# Altium schematic symbol library relay.SCHLIB: 425 symbols (part 1 of 3) (continued)
## G5V1 (continued)
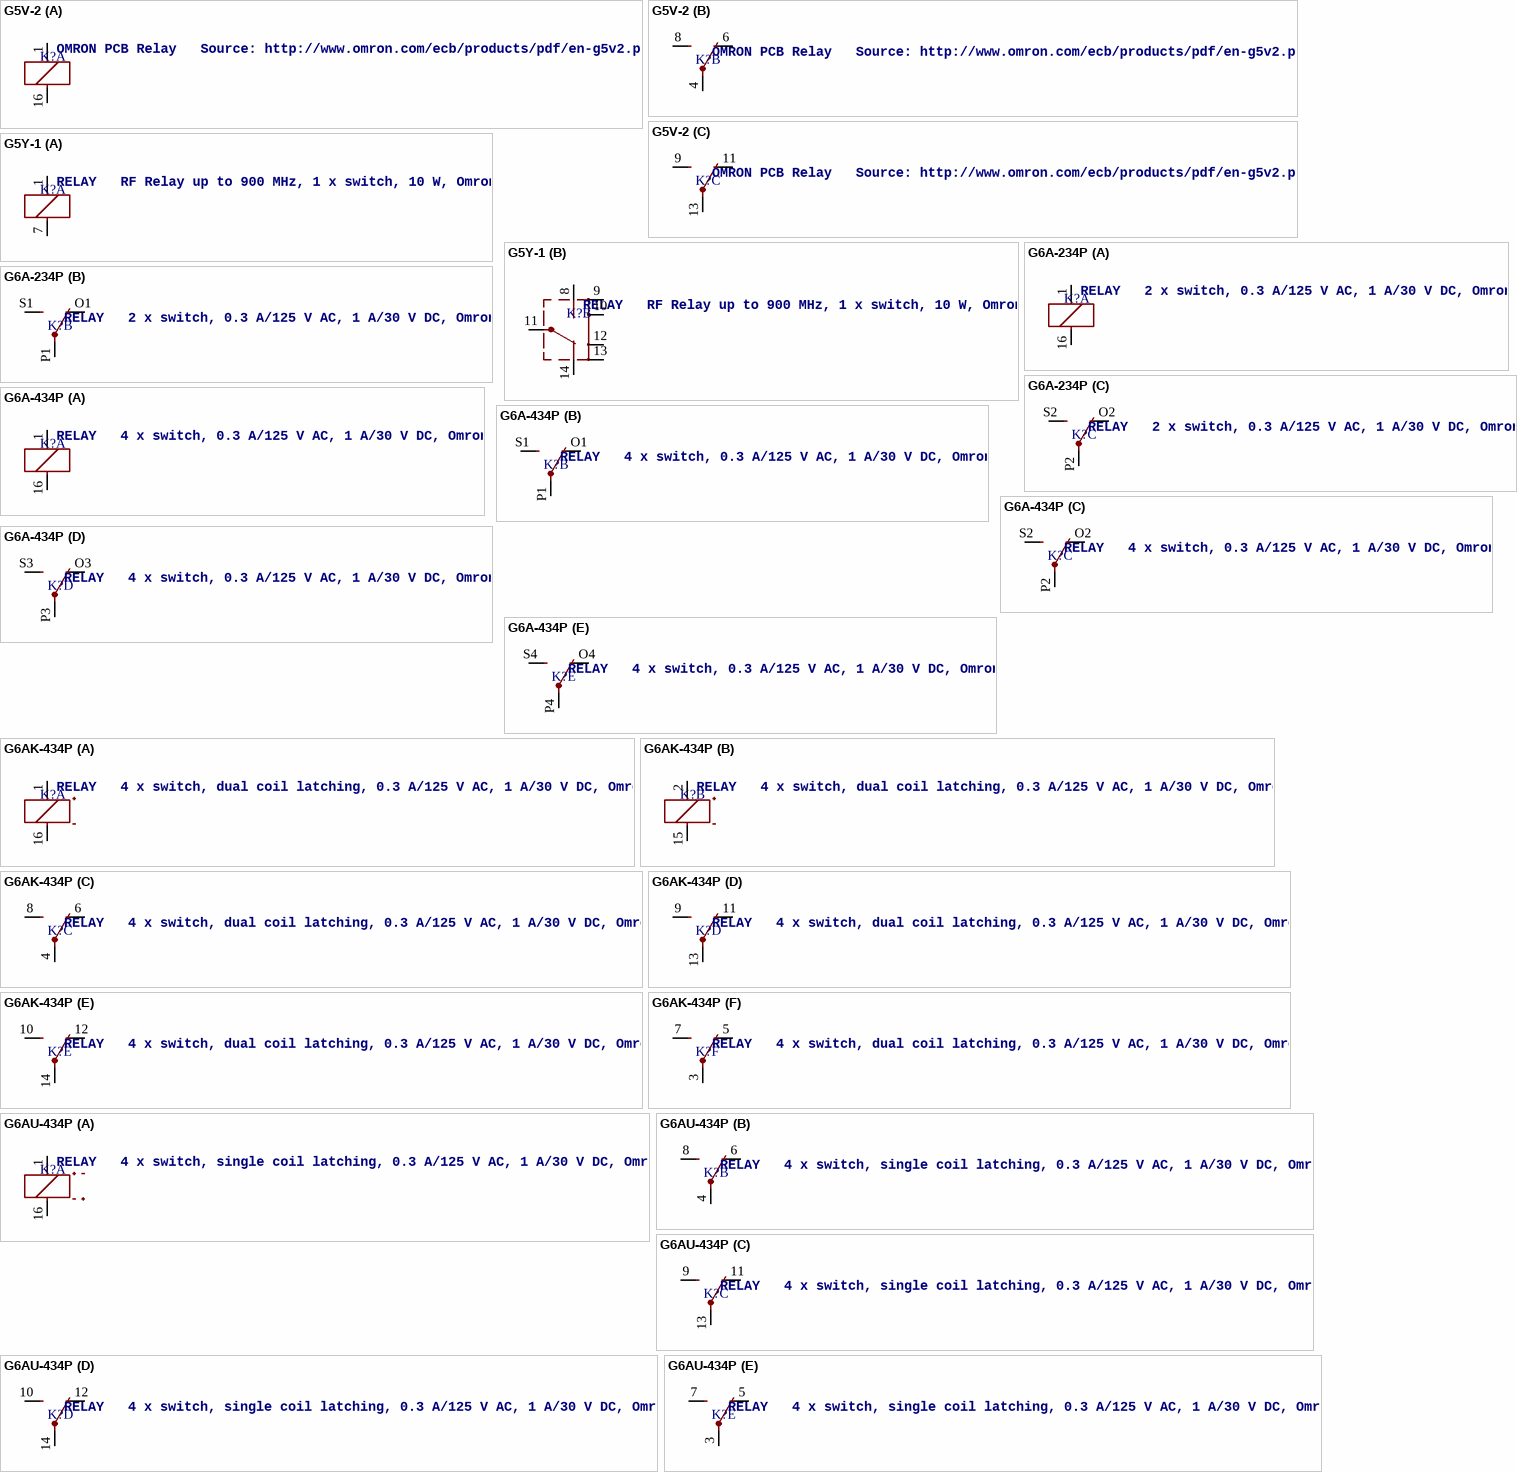
[diagram p9: symbols G5V-2 to G6AU-434P]

## G5V-2
designator K?, comment OMRON PCB Relay   Source: http://www.omron.com/ecb/products/pdf/en-g5v2.pdf
MPN: G5V-2 5DC; OC_FARNELL: 9949488; OC_NEWARK: 78K5703
footprint G5V-2
part A pins: 1, 16 2
part B pins: 4 P, 6 O, 8 S
part C pins: 9 S, 11 O, 13 P

## G5Y-1
designator K?, comment RELAY   RF Relay up to 900 MHz, 1 x switch, 10 W, Omron
OC_FARNELL: unknown; OC_NEWARK: unknown
footprint G5Y-1
part A pins: 1, 7 2
part B pins: 8 S, 9 ES@1, 10 ES@2, 11 P, 12 ES@3, 13 ES@4, 14 O

## G6A-234P
designator K?, comment RELAY   2 x switch, 0.3 A/125 V AC, 1 A/30 V DC, Omron
OC_FARNELL: unknown; OC_NEWARK: unknown
footprint G6A-234P
part A pins: 1, 16 2
part B pins: O1 O, P1 P, S1 S
part C pins: O2 O, P2 P, S2 S

## G6A-434P
designator K?, comment RELAY   4 x switch, 0.3 A/125 V AC, 1 A/30 V DC, Omron
OC_FARNELL: unknown; OC_NEWARK: unknown
footprint G6A-434P
part A pins: 1, 16 2
part B pins: O1 O, P1 P, S1 S
part C pins: O2 O, P2 P, S2 S
part D pins: O3 O, P3 P, S3 S
part E pins: O4 O, P4 P, S4 S

## G6AK-434P
designator K?, comment RELAY   4 x switch, dual coil latching, 0.3 A/125 V AC, 1 A/30 V DC, Omron
OC_FARNELL: unknown; OC_NEWARK: unknown
footprint G6AK-434P
part A pins: 1 +, 16 -
part B pins: 2 +, 15 -
part C pins: 4 P, 6 O, 8 S
part D pins: 9 S, 11 O, 13 P
part E pins: 10 S, 12 O, 14 P
part F pins: 3 P, 5 O, 7 S

## G6AU-434P
designator K?, comment RELAY   4 x switch, single coil latching, 0.3 A/125 V AC, 1 A/30 V DC, Omron
OC_FARNELL: unknown; OC_NEWARK: unknown
footprint G6AU-434P
part A pins: 1 +, 16 -
part B pins: 4 P, 6 O, 8 S
part C pins: 9 S, 11 O, 13 P
part D pins: 10 S, 12 O, 14 P
part E pins: 3 P, 5 O, 7 S

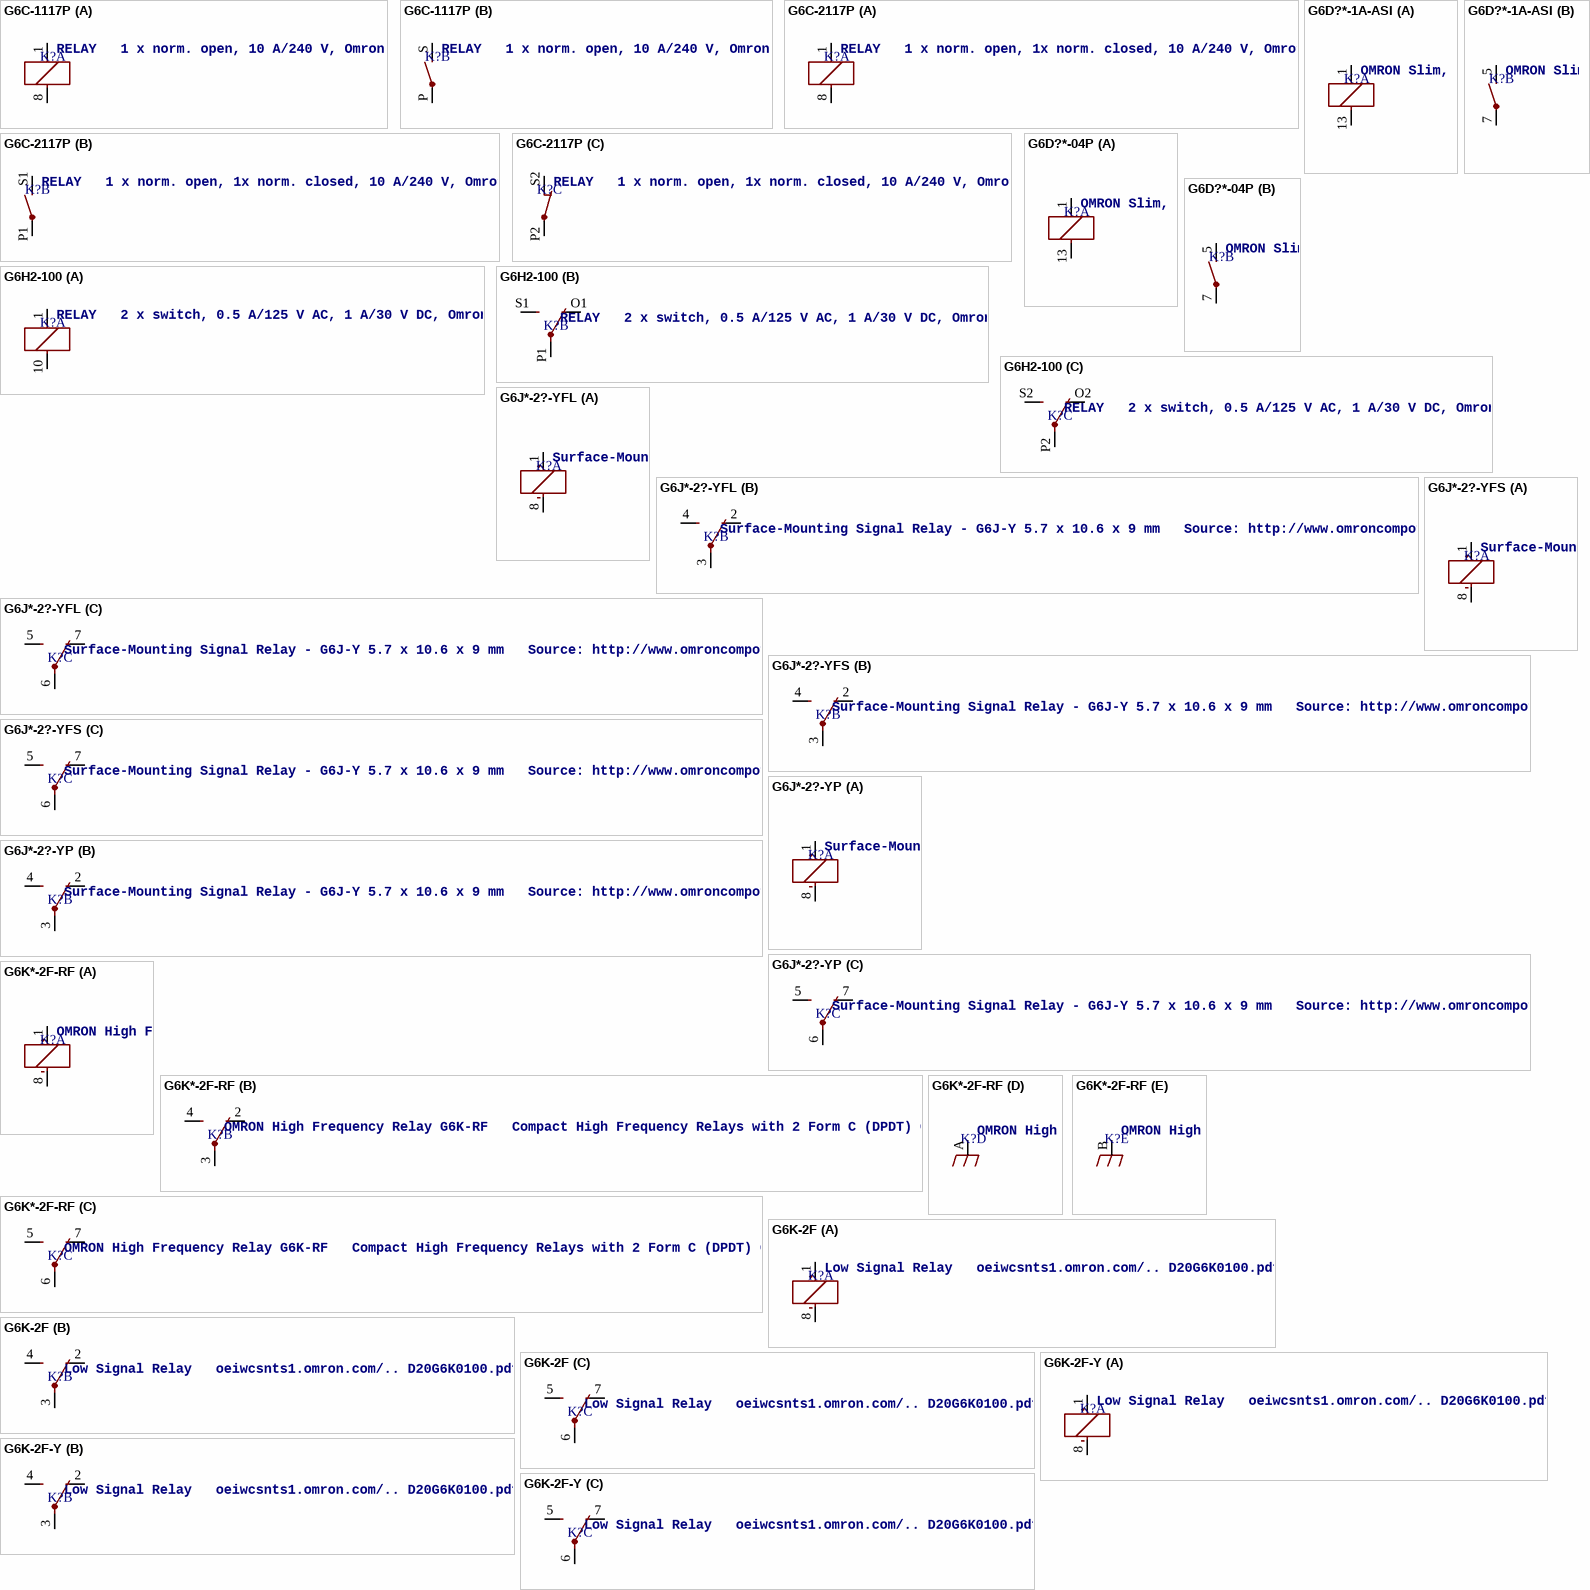
[diagram p10: symbols G6C-1117P to G6K-2F-Y]

## G6C-1117P
designator K?, comment RELAY   1 x norm. open, 10 A/240 V, Omron
OC_FARNELL: unknown; OC_NEWARK: unknown
footprint G6C-1117P
part A pins: 1, 8 2
part B pins: P, S

## G6C-2117P
designator K?, comment RELAY   1 x norm. open, 1x norm. closed, 10 A/240 V, Omron
OC_FARNELL: unknown; OC_NEWARK: unknown
footprint G6C-2117P
part A pins: 1, 8 2
part B pins: P1 P, S1 S
part C pins: P2 P, S2 O

## G6D?*-1A-ASI
designator K?, comment OMRON Slim, Miniature PCB Relay 17.5 × 6.5 × 12.5 mm   with Socked Source: http://ecb.omron.com.sg/pdf/relay/power/G6D.pdf
OC_FARNELL: unknown; OC_NEWARK: unknown; OC_FARNELL: 9812660
footprint G6D
part A pins: 1, 13 2
part B pins: 5 S, 7 P

## G6D?*-04P
designator K?, comment OMRON Slim, Miniature PCB Relay 17.5 × 6.5 × 12.5 mm   with Socked Source: http://ecb.omron.com.sg/pdf/relay/power/G6D.pdf
OC_FARNELL: unknown; OC_NEWARK: unknown
footprint G6D-SOCKET
part A pins: 1, 13 2
part B pins: 5 S, 7 P

## G6H2-100
designator K?, comment RELAY   2 x switch, 0.5 A/125 V AC, 1 A/30 V DC, Omron
OC_FARNELL: unknown; OC_NEWARK: unknown
footprint G6H2-100
part A pins: 1, 10 2
part B pins: O1 O, P1 P, S1 S
part C pins: O2 O, P2 P, S2 S

## G6J*-2?-YFL
designator K?, comment Surface-Mounting Signal Relay - G6J-Y 5.7 x 10.6 x 9 mm   Source: http://www.omroncomponents.eu/ .. K125-E2-02-X.pdf
MPN: G6J-2FL-Y-TR DC4.5; MPN: G6JU-2FL-Y DC3; OC_FARNELL: 1798618; OC_NEWARK: 04M9907; OC_FARNELL: unknown; OC_NEWARK: 04M9916
footprint G6J-2FL-Y
part A pins: 1 +, 8 -
part B pins: 2 O, 3 P, 4 S
part C pins: 5 S, 6 P, 7 O

## G6J*-2?-YFS
designator K?, comment Surface-Mounting Signal Relay - G6J-Y 5.7 x 10.6 x 9 mm   Source: http://www.omroncomponents.eu/ .. K125-E2-02-X.pdf
MPN: G6J-2FS-Y DC4.5; OC_FARNELL: unknown; OC_NEWARK: 04M9910; OC_NEWARK: unknown
footprint G6J-2FS-Y
part A pins: 1 +, 8 -
part B pins: 2 O, 3 P, 4 S
part C pins: 5 S, 6 P, 7 O

## G6J*-2?-YP
designator K?, comment Surface-Mounting Signal Relay - G6J-Y 5.7 x 10.6 x 9 mm   Source: http://www.omroncomponents.eu/ .. K125-E2-02-X.pdf
MPN: G6J-2P-Y-DC12; MPN: G6JU-2P-Y-DC12; MF: OMRON COMPONENTS USA; OC_FARNELL: unknown; OC_NEWARK: 70J9830; OC_NEWARK: 70J9842
footprint G6J-2P-Y
part A pins: 1 +, 8 -
part B pins: 2 O, 3 P, 4 S
part C pins: 5 S, 6 P, 7 O

## G6K*-2F-RF
designator K?, comment OMRON High Frequency Relay G6K-RF   Compact High Frequency Relays with 2 Form C (DPDT) Contacts Handles 1 A, 30 VDC discrete load and 1 W at 1 GHz high frequency load D20G6KRF0602.pdf
MPN: G6K-2F-RF-DC12; MF: OMRON COMPONENTS USA; OC_FARNELL: 1448181; OC_NEWARK: 73C8948; OC_FARNELL: unknown; OC_NEWARK: unknown
footprint G6K-RF
part A pins: 1 +, 8 -
part B pins: 2 O, 3 P, 4 S
part C pins: 5 S, 6 P, 7 O
part D pins: A SH
part E pins: B SH

## G6K-2F
designator K?, comment Low Signal Relay   oeiwcsnts1.omron.com/.. D20G6K0100.pdf
MPN: G6K-2F DC24; MF: OMRON COMPONENTS USA; OC_FARNELL: 1690427; OC_NEWARK: 36K7467
footprint G6K-2F
part A pins: 1 +, 8 -
part B pins: 2 O, 3 P, 4 S
part C pins: 5 S, 6 P, 7 O

## G6K-2F-Y
designator K?, comment Low Signal Relay   oeiwcsnts1.omron.com/.. D20G6K0100.pdf
MPN: G6K-2F-Y DC3; MF: OMRON COMPONENTS USA; OC_FARNELL: 1690316; OC_NEWARK: 89C6451
footprint G6K-2F-Y
part A pins: 1 +, 8 -
part B pins: 2 O, 3 P, 4 S
part C pins: 5 S, 6 P, 7 O

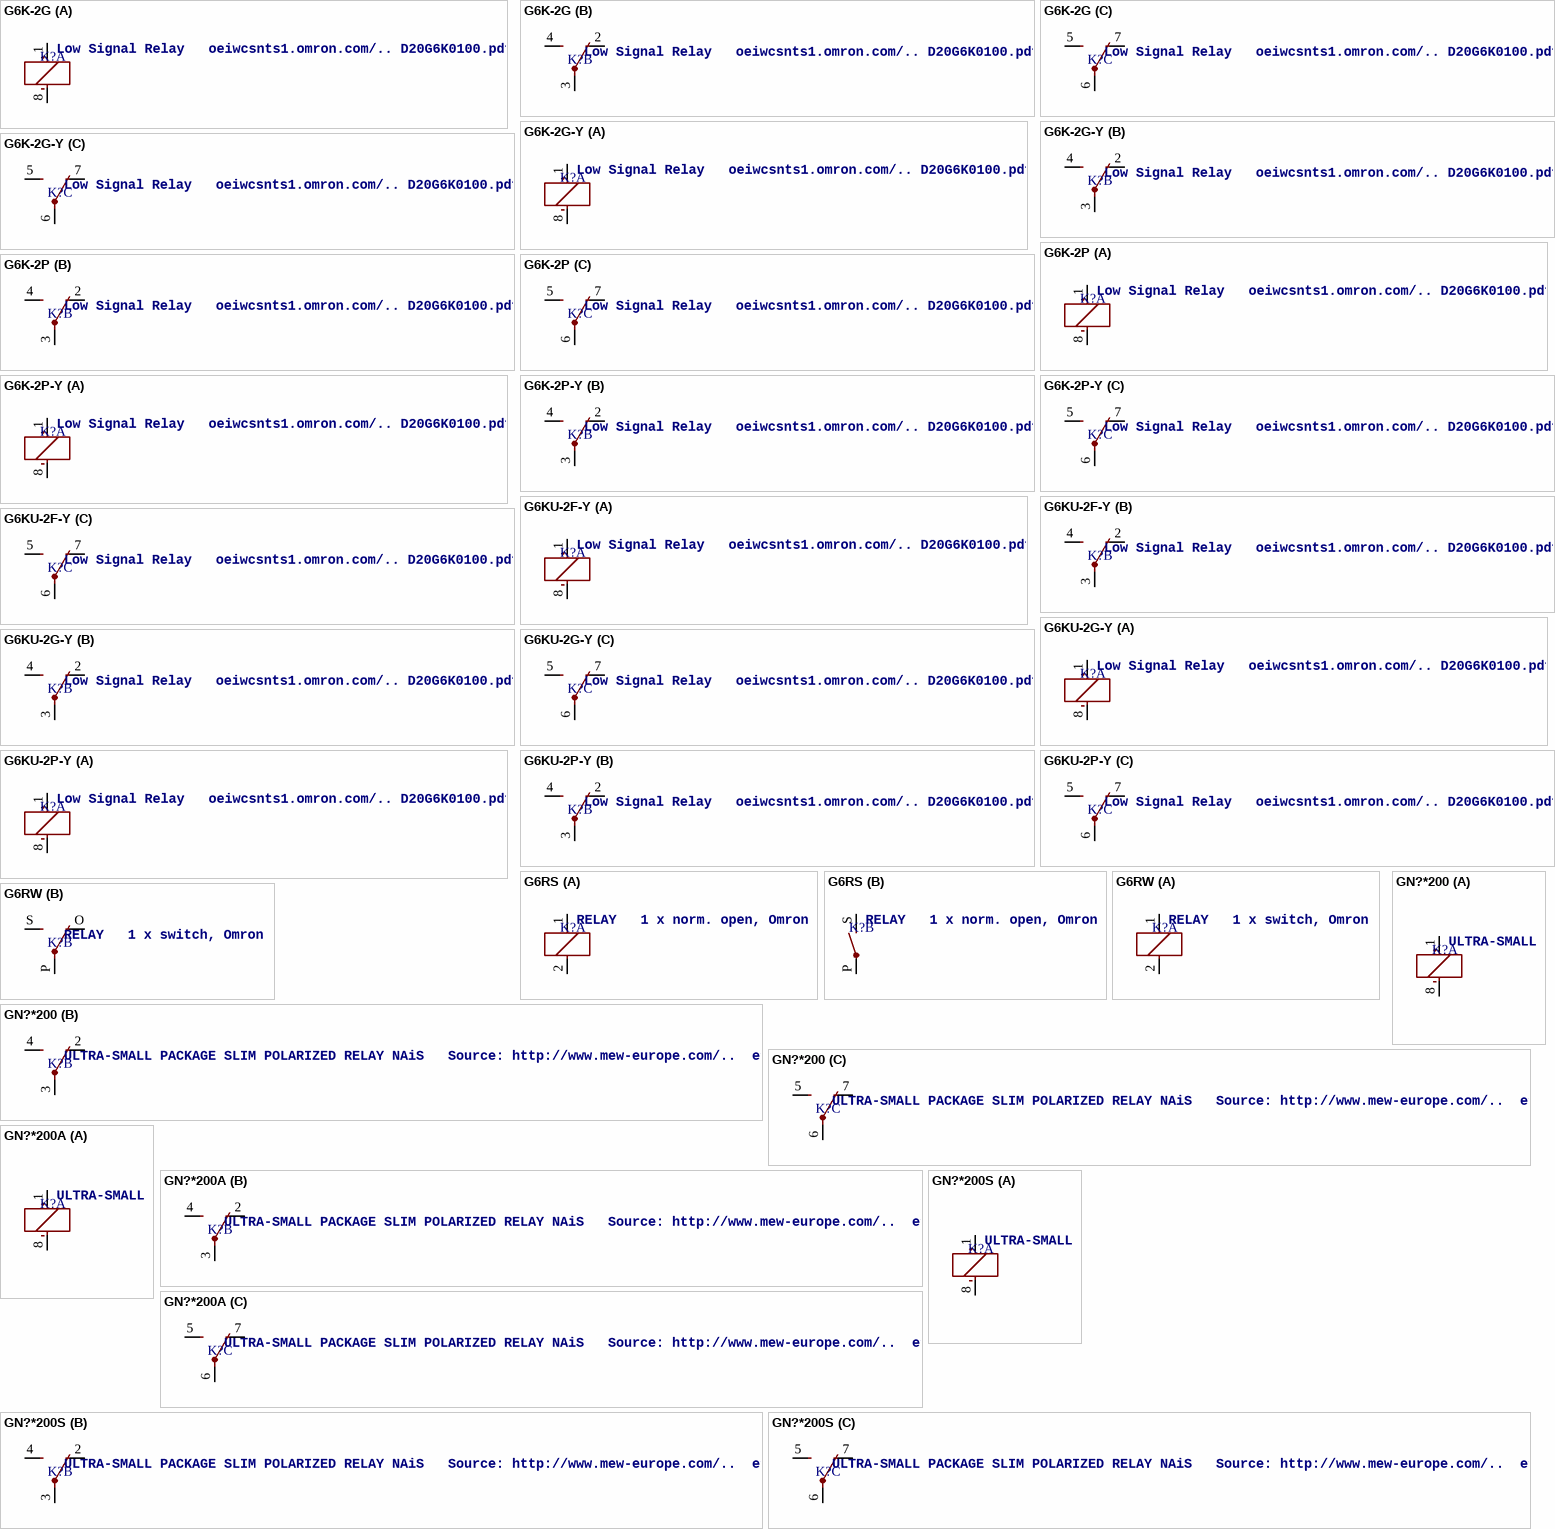
[diagram p11: symbols G6K-2G to GN?*200S]

## G6K-2G
designator K?, comment Low Signal Relay   oeiwcsnts1.omron.com/.. D20G6K0100.pdf
MPN: G6K-2G DC12; MF: OMRON COMPONENTS USA; OC_FARNELL: 4601695; OC_NEWARK: 93B9118
footprint G6K-2G
part A pins: 1 +, 8 -
part B pins: 2 O, 3 P, 4 S
part C pins: 5 S, 6 P, 7 O

## G6K-2G-Y
designator K?, comment Low Signal Relay   oeiwcsnts1.omron.com/.. D20G6K0100.pdf
OC_FARNELL: 4484794; OC_NEWARK: unknown
footprint G6K-2G-Y
part A pins: 1 +, 8 -
part B pins: 2 O, 3 P, 4 S
part C pins: 5 S, 6 P, 7 O

## G6K-2P
designator K?, comment Low Signal Relay   oeiwcsnts1.omron.com/.. D20G6K0100.pdf
MPN: G6K-2P DC3; MF: OMRON COMPONENTS USA; OC_FARNELL: 3937276; OC_NEWARK: 89C6482
footprint G6K-2P
part A pins: 1 +, 8 -
part B pins: 2 O, 3 P, 4 S
part C pins: 5 S, 6 P, 7 O

## G6K-2P-Y
designator K?, comment Low Signal Relay   oeiwcsnts1.omron.com/.. D20G6K0100.pdf
MPN: G6K-2P-Y DC12; MF: OMRON COMPONENTS USA; OC_FARNELL: 3937276; OC_NEWARK: 34C3464
footprint G6K-2P-Y
part A pins: 1 +, 8 -
part B pins: 2 O, 3 P, 4 S
part C pins: 5 S, 6 P, 7 O

## G6KU-2F-Y
designator K?, comment Low Signal Relay   oeiwcsnts1.omron.com/.. D20G6K0100.pdf
MPN: G6KU-2F-Y DC3; MF: OMRON COMPONENTS USA; OC_FARNELL: unknown; OC_NEWARK: 89C6496
footprint G6KU-2F-Y
part A pins: 1 +, 8 -
part B pins: 2 O, 3 P, 4 S
part C pins: 5 S, 6 P, 7 O

## G6KU-2G-Y
designator K?, comment Low Signal Relay   oeiwcsnts1.omron.com/.. D20G6K0100.pdf
MPN: G6KU-2G-Y DC5; MF: OMRON COMPONENTS USA; OC_FARNELL: 1690320; OC_NEWARK: 89C6505
footprint G6KU-2G-Y
part A pins: 1 +, 8 -
part B pins: 2 O, 3 P, 4 S
part C pins: 5 S, 6 P, 7 O

## G6KU-2P-Y
designator K?, comment Low Signal Relay   oeiwcsnts1.omron.com/.. D20G6K0100.pdf
MPN: G6KU-2P-Y DC5; MF: OMRON COMPONENTS USA; OC_FARNELL: unknown; OC_NEWARK: 35K4536
footprint G6KU-2P-Y
part A pins: 1 +, 8 -
part B pins: 2 O, 3 P, 4 S
part C pins: 5 S, 6 P, 7 O

## G6RS
designator K?, comment RELAY   1 x norm. open, Omron
OC_FARNELL: unknown; OC_NEWARK: unknown
footprint G6RS
part A pins: 1, 2
part B pins: P, S

## G6RW
designator K?, comment RELAY   1 x switch, Omron
OC_FARNELL: unknown; OC_NEWARK: unknown
footprint G6RW
part A pins: 1, 2
part B pins: O, P, S

## GN?*200
designator K?, comment ULTRA-SMALL PACKAGE SLIM POLARIZED RELAY NAiS   Source: http://www.mew-europe.com/..  en_ds_61007_0000.pdf
MPN: AGN20003; MPN: AGN20006; MPN: AGN20009; MPN: AGN20012; MPN: AGN2001H; MPN: AGN20024; MPN: AGN2004H; MF: AROMAT/ MATSUSHITA; OC_FARNELL: unknown; OC_NEWARK: 13P0830; OC_NEWARK: 13P0831; OC_NEWARK: 10C3280; OC_FARNELL: 3104783; OC_NEWARK: 13P0832; OC_NEWARK: 10C3281; OC_FARNELL: 4364211; OC_NEWARK: 13P0833; OC_FARNELL: 3104771; OC_NEWARK: 13P0834
footprint GN
part A pins: 1 +, 8 -
part B pins: 2 O, 3 P, 4 S
part C pins: 5 S, 6 P, 7 O

## GN?*200A
designator K?, comment ULTRA-SMALL PACKAGE SLIM POLARIZED RELAY NAiS   Source: http://www.mew-europe.com/..  en_ds_61007_0000.pdf
MPN: AGN200A03; MPN: AGN200A06; MPN: AGN200A09Z; MPN: AGN200A12; MPN: AGN200A24; MPN: AGN200A4H; OC_FARNELL: unknown; OC_NEWARK: 13P0812; OC_NEWARK: 13P0814; OC_NEWARK: 13P0815; OC_FARNELL: 3104801; OC_NEWARK: 13P0816; OC_NEWARK: unknown; OC_NEWARK: 13P0818; OC_FARNELL: 3104795; OC_NEWARK: 13P0820
footprint GN-A
part A pins: 1 +, 8 -
part B pins: 2 O, 3 P, 4 S
part C pins: 5 S, 6 P, 7 O

## GN?*200S
designator K?, comment ULTRA-SMALL PACKAGE SLIM POLARIZED RELAY NAiS   Source: http://www.mew-europe.com/..  en_ds_61007_0000.pdf
MPN: AGN200S03; MPN: AGN200S12; MPN: AGN200S24; MPN: AGN200S4H; OC_FARNELL: unknown; OC_NEWARK: 13P0822; OC_NEWARK: unknown; OC_FARNELL: 1448335; OC_NEWARK: 13P0824; OC_NEWARK: 13P0826; OC_NEWARK: 13P0828
footprint GN-S
part A pins: 1 +, 8 -
part B pins: 2 O, 3 P, 4 S
part C pins: 5 S, 6 P, 7 O

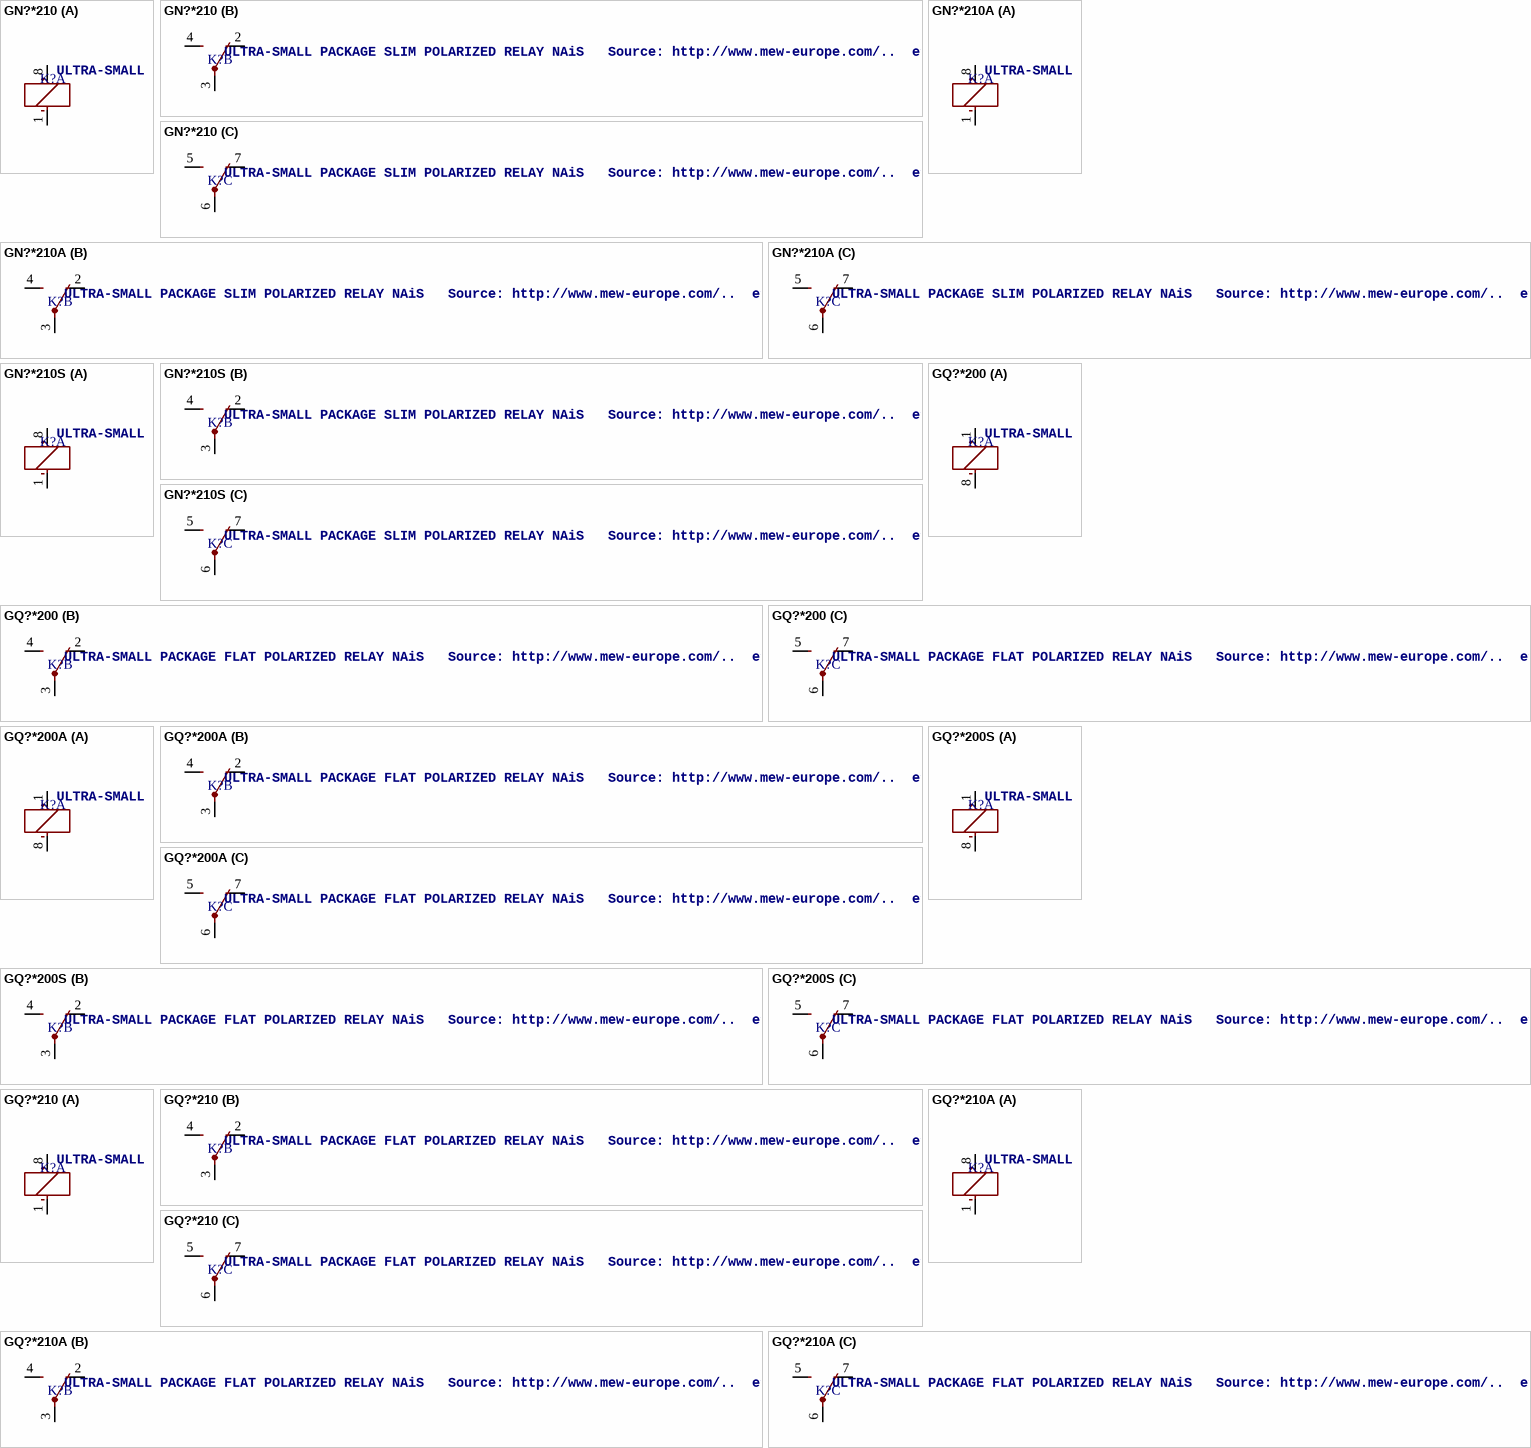
[diagram p12: symbols GN?*210 to GQ?*210A]

## GN?*210
designator K?, comment ULTRA-SMALL PACKAGE SLIM POLARIZED RELAY NAiS   Source: http://www.mew-europe.com/..  en_ds_61007_0000.pdf
MPN: AGN21003; MPN: AGN21006; MPN: AGN21012; MPN: AGN2104H; OC_FARNELL: unknown; OC_NEWARK: 15P8576; OC_NEWARK: 15P8577; OC_NEWARK: unknown; OC_NEWARK: 15P8578; OC_NEWARK: 15P8579
footprint GN
part A pins: 1 -, 8 +
part B pins: 2 O, 3 P, 4 S
part C pins: 5 S, 6 P, 7 O

## GN?*210A
designator K?, comment ULTRA-SMALL PACKAGE SLIM POLARIZED RELAY NAiS   Source: http://www.mew-europe.com/..  en_ds_61007_0000.pdf
MPN: AGN210A03; MPN: AGN210A12; MPN: AGN210A4H; MF: AROMAT/ MATSUSHITA; OC_FARNELL: unknown; OC_NEWARK: 15P8571; OC_NEWARK: unknown; OC_NEWARK: 10C3303; OC_NEWARK: 15P8573
footprint GN-A
part A pins: 1 -, 8 +
part B pins: 2 O, 3 P, 4 S
part C pins: 5 S, 6 P, 7 O

## GN?*210S
designator K?, comment ULTRA-SMALL PACKAGE SLIM POLARIZED RELAY NAiS   Source: http://www.mew-europe.com/..  en_ds_61007_0000.pdf
MPN: AGN210S03; MPN: AGN210S12; MF: AROMAT/ MATSUSHITA; OC_FARNELL: unknown; OC_NEWARK: 15P8575; OC_NEWARK: unknown; OC_NEWARK: 10C3320
footprint GN-S
part A pins: 1 -, 8 +
part B pins: 2 O, 3 P, 4 S
part C pins: 5 S, 6 P, 7 O

## GQ?*200
designator K?, comment ULTRA-SMALL PACKAGE FLAT POLARIZED RELAY NAiS   Source: http://www.mew-europe.com/..  en_ds_61008_0000.pdf
MPN: AGQ20003; MPN: AGQ20006; MPN: AGQ20009; MPN: AGQ20012; MPN: AGQ20024; MPN: AGQ2004H; MF: AROMAT/ MATSUSHITA; OC_FARNELL: unknown; OC_NEWARK: 13P0847; OC_NEWARK: 10C3360; OC_NEWARK: 10C3361; OC_FARNELL: 3104825; OC_NEWARK: 13P0849; OC_NEWARK: unknown; OC_NEWARK: 13P0850; OC_FARNELL: 3104813; OC_NEWARK: 13P0851
footprint GQ
part A pins: 1 +, 8 -
part B pins: 2 O, 3 P, 4 S
part C pins: 5 S, 6 P, 7 O

## GQ?*200A
designator K?, comment ULTRA-SMALL PACKAGE FLAT POLARIZED RELAY NAiS   Source: http://www.mew-europe.com/..  en_ds_61008_0000.pdf
MPN: AGQ200A03; MPN: AGQ200A09Z; MPN: AGQ200A12; MPN: AGQ200A24; MPN: AGQ200A4H; MF: AROMAT/ MATSUSHITA; OC_FARNELL: 1448336; OC_NEWARK: 13P0835; OC_FARNELL: unknown; OC_NEWARK: unknown; OC_NEWARK: 10C3339; OC_FARNELL: 3104849; OC_NEWARK: 13P0836; OC_FARNELL: 1448337; OC_NEWARK: 13P0837; OC_FARNELL: 3104837; OC_NEWARK: 13P0838
footprint GN-A
part A pins: 1 +, 8 -
part B pins: 2 O, 3 P, 4 S
part C pins: 5 S, 6 P, 7 O

## GQ?*200S
designator K?, comment ULTRA-SMALL PACKAGE FLAT POLARIZED RELAY NAiS   Source: http://www.mew-europe.com/..  en_ds_61008_0000.pdf
MPN: AGQ200S03; MPN: AGQ200S12; MPN: AGQ200S1H; MPN: AGQ200S24; MPN: AGQ200S4H; MF: AROMAT/ MATSUSHITA; OC_FARNELL: unknown; OC_NEWARK: 10C3345; OC_NEWARK: unknown; OC_NEWARK: 10C3353; OC_NEWARK: 13P0842; OC_NEWARK: 10C3355; OC_NEWARK: 10C3357
footprint GN-S
part A pins: 1 +, 8 -
part B pins: 2 O, 3 P, 4 S
part C pins: 5 S, 6 P, 7 O

## GQ?*210
designator K?, comment ULTRA-SMALL PACKAGE FLAT POLARIZED RELAY NAiS   Source: http://www.mew-europe.com/..  en_ds_61008_0000.pdf
MPN: AGQ21003; MPN: AGQ21009; MPN: AGQ2101H; MPN: AGQ21024; MPN: AGQ2104H; MF: AROMAT/ MATSUSHITA; OC_FARNELL: unknown; OC_NEWARK: 10C3391; OC_NEWARK: unknown; OC_NEWARK: 15P8586; OC_NEWARK: 10C3394; OC_NEWARK: 10C3396; OC_NEWARK: 15P8587
footprint GQ
part A pins: 1 -, 8 +
part B pins: 2 O, 3 P, 4 S
part C pins: 5 S, 6 P, 7 O

## GQ?*210A
designator K?, comment ULTRA-SMALL PACKAGE FLAT POLARIZED RELAY NAiS   Source: http://www.mew-europe.com/..  en_ds_61008_0000.pdf
MPN: AGQ210A03; MPN: AGQ210A1H; MPN: AGQ210A4H; OC_FARNELL: unknown; OC_NEWARK: 15P8580; OC_NEWARK: unknown; OC_NEWARK: 15P8581; OC_NEWARK: 15P8582
footprint GQ-A
part A pins: 1 -, 8 +
part B pins: 2 O, 3 P, 4 S
part C pins: 5 S, 6 P, 7 O

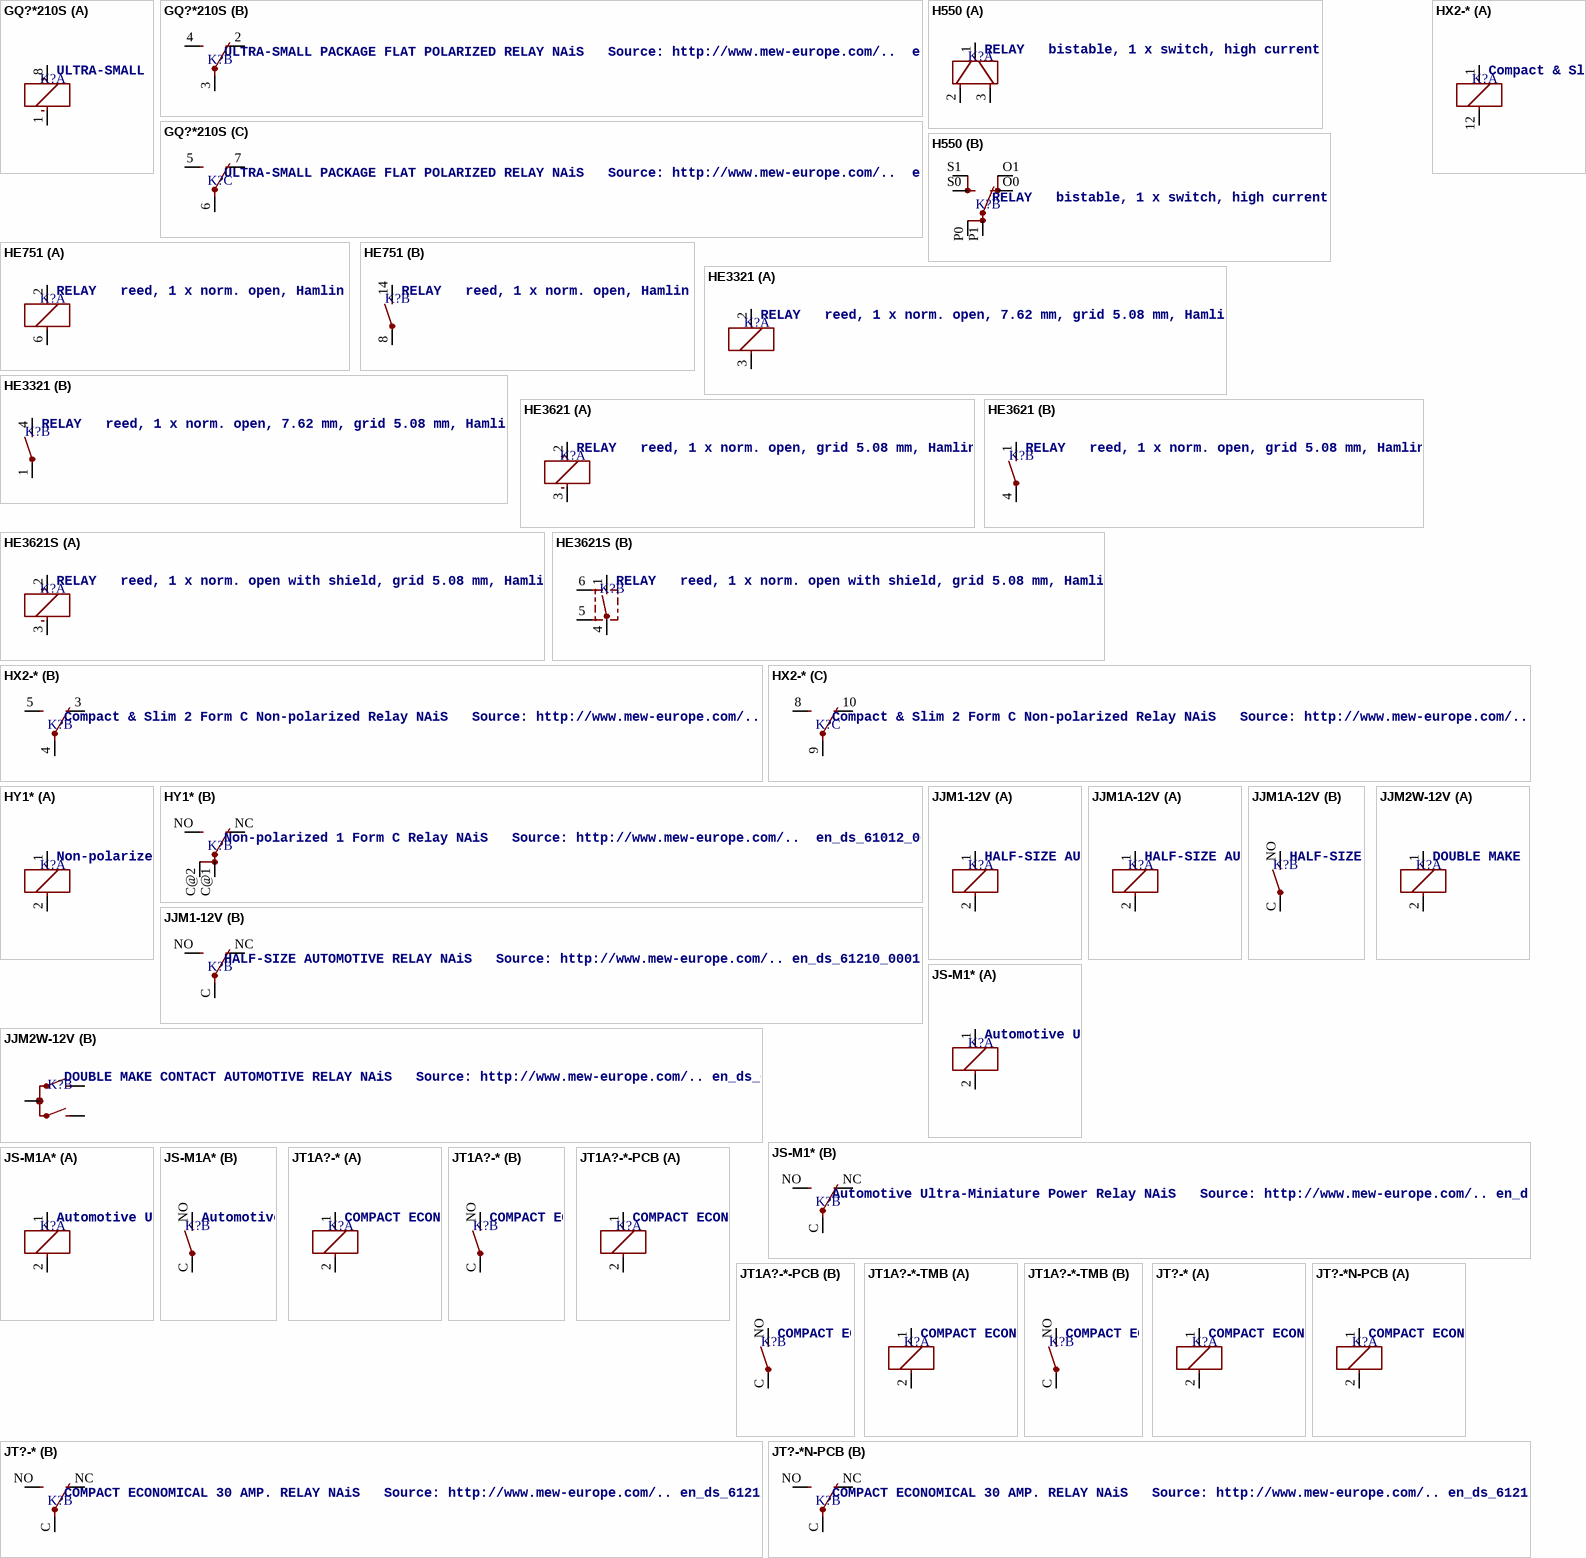
[diagram p13: symbols GQ?*210S to JT?-*N-PCB]

## GQ?*210S
designator K?, comment ULTRA-SMALL PACKAGE FLAT POLARIZED RELAY NAiS   Source: http://www.mew-europe.com/..  en_ds_61008_0000.pdf
MPN: AGQ210S4H; OC_FARNELL: unknown; OC_NEWARK: unknown; OC_NEWARK: 15P8583
footprint GN-S
part A pins: 1 -, 8 +
part B pins: 2 O, 3 P, 4 S
part C pins: 5 S, 6 P, 7 O

## H550
designator K?, comment RELAY   bistable, 1 x switch, high current
OC_FARNELL: unknown; OC_NEWARK: unknown
footprint H550
part A pins: 1, 2, 3
part B pins: O0 O, O1 O@1, P0 P@1, P1 P, S0 S, S1 S@1

## HE751
designator K?, comment RELAY   reed, 1 x norm. open, Hamlin
OC_FARNELL: unknown; OC_NEWARK: unknown
footprint HE751
part A pins: 2 1, 6 2
part B pins: 8 P, 14 S

## HE3321
designator K?, comment RELAY   reed, 1 x norm. open, 7.62 mm, grid 5.08 mm, Hamlin
MPN: HE3321C1200; MF: HAMLIN; OC_FARNELL: unknown; OC_NEWARK: 46F3928
footprint HE3321
part A pins: 2 1, 3 2
part B pins: 1 P, 4 S

## HE3621
designator K?, comment RELAY   reed, 1 x norm. open, grid 5.08 mm, Hamlin
MPN: HE3621A2410; MF: HAMLIN; OC_FARNELL: 9561943; OC_NEWARK: 50F7993
footprint HE3621
part A pins: 2 +, 3 -
part B pins: 1 S, 4 P

## HE3621S
designator K?, comment RELAY   reed, 1 x norm. open with shield, grid 5.08 mm, Hamlin
OC_FARNELL: unknown; OC_NEWARK: unknown
footprint HE3621S
part A pins: 2 +, 3 -
part B pins: 1 S, 4 P, 5 ES@1, 6 ES@2

## HX2-*
designator K?, comment Compact & Slim 2 Form C Non-polarized Relay NAiS   Source: http://www.mew-europe.com/..  en_ds_61011_0000.pdf
OC_FARNELL: unknown; OC_NEWARK: unknown
footprint HX
part A pins: 1, 12 2
part B pins: 3 O, 4 P, 5 S
part C pins: 8 S, 9 P, 10 O

## HY1*
designator K?, comment Non-polarized 1 Form C Relay NAiS   Source: http://www.mew-europe.com/..  en_ds_61012_0000.pdf
MPN: HY1-12V; MPN: HY1-24V; MPN: HY1-3V; MPN: HY1-5V; MPN: HY1-6V; MPN: HY1-9V; MPN: HY1Z-12V; MPN: HY1Z-24V; MPN: HY1Z-4.5V; MPN: HY1Z-5V; MPN: HY1Z-9V; MF: AROMAT/ MATSUSHITA; OC_FARNELL: unknown; OC_NEWARK: unknown; OC_NEWARK: 10C6688; OC_NEWARK: 10C6689; OC_NEWARK: 10C6690; OC_NEWARK: 10C6692; OC_NEWARK: 10C6693; OC_NEWARK: 10C6694; OC_NEWARK: 10C6704; OC_NEWARK: 10C6705; OC_NEWARK: 10C6707; OC_NEWARK: 52F9234; OC_NEWARK: 10C6709
footprint HY
part A pins: 1, 2
part B pins: C@1 P, C@2 P@1, NC O, NO S

## JJM1-12V
designator K?, comment HALF-SIZE AUTOMOTIVE RELAY NAiS   Source: http://www.mew-europe.com/.. en_ds_61210_0001.pdf
MPN: JJM1-12V; MF: AROMAT/ MATSUSHITA; OC_FARNELL: unknown; OC_NEWARK: 10C7318
footprint JJM1C
part A pins: 1, 2
part B pins: C P, NC O, NO S
